# Altium footprint library iuh-thuc-hanh.PcbLib: 72 footprints (part 4 of 5)
Each footprint in its own frame and in the unit in brackets; x right, y up, seen from the top. Pads: shape width x height; smd on the part's side, far side on the other; paste and mask are expansions set on the pad; w line width, h text height; cw(c..) or ccw(c..) is an arc to the next point about the centre after c.
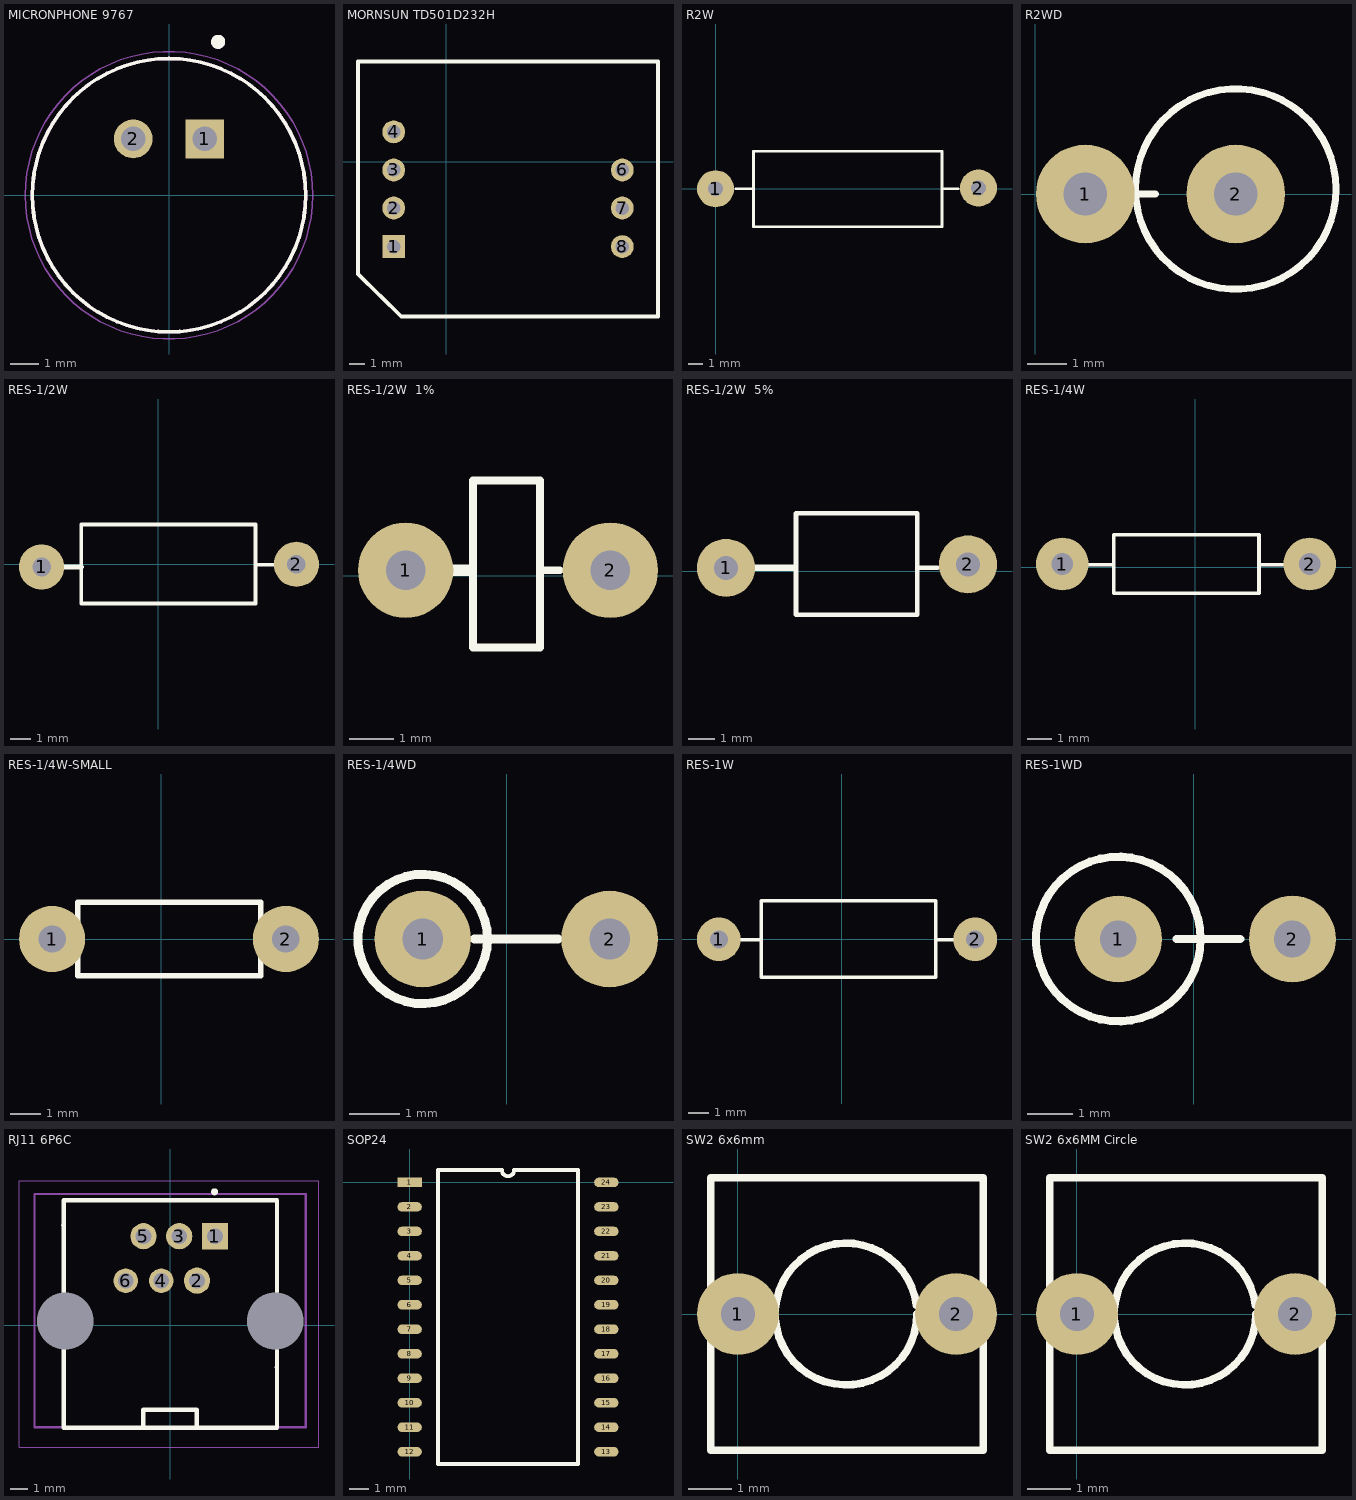
[diagram p3: the footprints below, top view; thin cyan lines are the x and y axes]

## MICRONPHONE 9767 [mm]
pads (2):
  rect 1.378x1.378 hole 0.87: 1(1.27,2)
  round 1.378 hole 0.87: 2(-1.27,2)
Top Overlay:
  circle w0.3: c1.741,5.443 r0.1
  circle w0.127: c0,0 r4.85
Mechanical 13:
  circle w0.3: c1.741,5.443 r0.1
  circle w0.127: c0,0 r4.85
Mechanical 15:
  circle w0.05: c0,0 r5.1
3D body "electret mic 9.6x5x2.54 v5.step": height 5, standoff -2.73, extent -4.85,-4.596 4.85,5.104

## MORNSUN TD501D232H [mm]
pads (7):
  rect 1.524x1.524 hole 0.9: 1(-3.5,-5.65)
  round 1.524 hole 0.9: 2(-3.5,-3.08) 3(-3.5,-0.54) 4(-3.5,2) 6(11.74,-0.54) 7(11.74,-3.08) 8(11.74,-5.65)
Top Overlay:
  lines w0.254: -5.88,3.5 -5.88,3.645 -5.88,3.772 ; -5.88,-7.468 -5.88,6.69 14.12,6.69 14.12,-10.31 -3,-10.31 -5.88,-7.468
3D body "User Library-MORNSUN_TD301D232H.step": height 7.5, standoff -2, extent -5.809,-10.287 14.191,6.713

## R2W [mm] "R2W, 2 pin, 700mil"
height 5.08
pads (2):
  round 2.5 hole 1: 1(0,0) 2(17.755,0.051)
Top Overlay:
  lines w0.178: 1.372,0 2.565,0 ; 15.316,0 16.383,0 ; 2.565,0 2.565,-2.565 15.291,-2.565 15.291,2.54 2.565,2.54 2.565,0
3D body "SW3dPS-AXIAL_RESISTOR(3W).STEP": height 8.3, standoff -2, extent -2.362,-3.327 19.838,3.273

## R2WD [mm] "R2W, 2 pin, 150mil"
height 5.08
pads (2):
  round 2.5 hole 1.1: 1(1.27,0) 2(5.08,0)
Top Overlay:
  circle w0.178: c5.08,0.127 r2.54
  lines w0.178: 2.159,0 3.048,0
3D body "User Library-User Library-RES-1W_stand_up_6mm.step": height 13.97, standoff -5.5, extent -1.25,-2.413 7.6,2.587

## RES-1/2W [mil]
height 100
pads (2):
  round 85 hole 35: 1(-220,-5) 2(260,0)
Top Overlay:
  lines w7: 183,-1 221,-1 ; -145,-73.81 183,-73.81 183,75 -145,75 -145,-73.81
  lines w10: -195,-5 -145,-5
3D body "User Library-Metal film resistor0_5W.step": height 121.06, standoff -118.11, extent -230,-60 270,56.14

## RES-1/2W  1% [mil]
height 100
pads (2):
  round 85 hole 35: 1(72.5,5) 2(255.12,5)
Top Overlay:
  lines w7: 192.5,5 210,5 ; 132.5,-63.81 132.5,85 192.5,85 192.5,-63.81 132.5,-63.81
  lines w10: 97.5,5 127.5,5

## RES-1/2W  5% [mil]
height 100
pads (2):
  round 85 hole 35: 1(72.5,5) 2(426.85,10)
Top Overlay:
  lines w7: 353.09,5 365,5 382.5,5 ; 175,-63.81 175,85 352.5,85 352.5,-63.81 175,-63.81
  lines w10: 97.5,5 127.5,5 172.5,5

## RES-1/4W [mil]
height 100
pads (2):
  round 85 hole 35: 1(-215,5) 2(185,5)
Top Overlay:
  lines w5.91: -173,4 -132,4 ; 103,4 141,4 ; -132,-42.24 -132,52.25 103,52.25 103,-42.24 -132,-42.24
3D body "User Library-Res40-Axial Short 0_25W-0_1R.step": height 95, standoff -78.74, extent -226.8,-42.24 196.82,52.25

## RES-1/4W-SMALL [mil]
height 100
pads (2):
  round 85 hole 35: 1(-140,0) 2(160,0)
Top Overlay:
  lines w7: -148,-1 -107,-1 ; 128,-1 166,-1 ; -107,-47.24 128,-47.24 128,47.25 -107,47.25 -107,-47.24
3D body "User Library-R-Axial-0_25W-7_62.step": height 97.4, standoff -146.85, extent -151.8,-47.39 171.82,47.4

## RES-1/4WD [mil]
height 100
pads (2):
  round 75 hole 31.5: 1(-65,0) 2(80,0)
Top Overlay:
  circle w7: c-65,0 r50.25
  lines w7: -25,0 40,0
3D body "User Library-RESAD375W60L650D230_0_25W.STEP": height 379.42, standoff -104.83, extent -112.36,-45 92.36,45.55

## RES-1W [mil]
height 100
pads (2):
  round 85 hole 35: 1(-240,0) 2(260,0)
Top Overlay:
  lines w7: -198,-1 -157,-1 ; 183,-1 221,-1 ; -157,-73.81 183,-73.81 183,75 -157,75 -157,-73.81
3D body "User Library-Res50-Axial 0_5W-3_3K.step": height 188.98, standoff -180.12, extent -254.76,-73.81 274.77,73.82

## RES-1WD [mil]
height 100
pads (2):
  round 75 hole 31.5: 1(-65,0) 2(85,0)
Top Overlay:
  circle w7: c-65,0 r70.87
  lines w7: -15,0 40,0
3D body "SW3DPS-0_5W METAL FILM RESISTOR-DEFAULT.STEP": height 498.19, standoff -198.66, extent -135,-66.92 105.16,66.93

## RJ11 6P6C [mm]
pads (8):
  rect 1.5x1.5 hole 0.9: 1(2.559,5.08)
  round 1.5 hole 0.9: 2(1.539,2.54) 3(0.519,5.08) 5(-1.521,5.08)
  round 1.4 hole 0.9: 4(-0.501,2.54) 6(-2.541,2.54)
  round 2.3 hole 3.25 unplated: ""(-5.991,0.24) ""(6.009,0.24)
Top Overlay:
  circle w0.2: c2.54,7.62 r0.1
  lines w0.254: -6.096,5.715 -6.091,5.71 ; -1.524,-5.842 -1.524,-4.842 1.524,-4.842 1.524,-5.842 ; 6.096,-2.413 6.109,-2.426 ; -6.091,-5.86 6.109,-5.86 6.109,7.14 -6.091,7.14 -6.091,-5.86
Mechanical 13:
  lines w0.127: -7.747,-5.842 7.747,-5.842 7.747,7.493 -7.747,7.493 -7.747,-5.842
Mechanical 15:
  lines w0.05: -8.636,-6.985 8.509,-6.985 8.509,8.255 -8.636,8.255 -8.636,-6.985
3D body "TJ6P6C gray.stp": height 14.55, standoff -3.2, extent -7.244,-5.695 7.256,7.305

## SOP24 [mm]
pads (24):
  rect 1.27x0.49 smd: 1(0,0)
  oval 1.27x0.49 smd: 2(0,-1.27) 3(0,-2.54) 4(0,-3.81) 5(0,-5.08) 6(0,-6.35) 7(0,-7.62) 8(0,-8.89) 9(0,-10.16) 10(0,-11.43) 11(0,-12.7) 12(0,-13.97) 13(10.2,-13.97) 14(10.2,-12.7) 15(10.2,-11.43) 16(10.2,-10.16) 17(10.2,-8.89) 18(10.2,-7.62) 19(10.2,-6.35) 20(10.2,-5.08) 21(10.2,-3.81) 22(10.2,-2.54) 23(10.2,-1.27) 24(10.2,0)
Top Overlay:
  lines w0.2: 1.47,-14.605 8.73,-14.605 8.73,0.635 5.417,0.635 cw(c5.1,0.635) 4.782,0.635 1.47,0.635 1.47,-14.605

## SW2 6x6mm [mil] "SW button 2pin, 250x 250 mil"
height 100
pads (2):
  round 75 hole 31: 1(0,0) 2(200,0)
Top Overlay:
  lines w7: 163.64,8.26 ccw(c99.17,0) 164.17,0 ; -25,-125 225,-125 225,125 -25,125 -25,-125
3D body "82574 tact switch.stp": height 197, standoff -200, extent -22.73,-122.63 222.73,122.63

## SW2 6x6MM Circle [mil] "SW button 2pin, 250x 250 mil 6x6mm"
height 100
pads (2):
  round 75 hole 31: 1(0,0) 2(200,0)
Top Overlay:
  lines w7: 163.64,8.26 ccw(c99.17,0) 164.17,0 ; -25,-125 225,-125 225,125 -25,125 -25,-125
3D body "Push Button Switch 2-Pin.STEP": height 181.1, standoff -78.74, extent -52.32,-122.05 250.83,122.05